# Altium footprint library YS_PCBLIB.PcbLib: 133 footprints (part 6 of 9)
Each footprint in its own frame and in the unit in brackets; x right, y up, seen from the top. Pads: shape width x height; smd on the part's side, far side on the other; paste and mask are expansions set on the pad; w line width, h text height; cw(c..) or ccw(c..) is an arc to the next point about the centre after c.
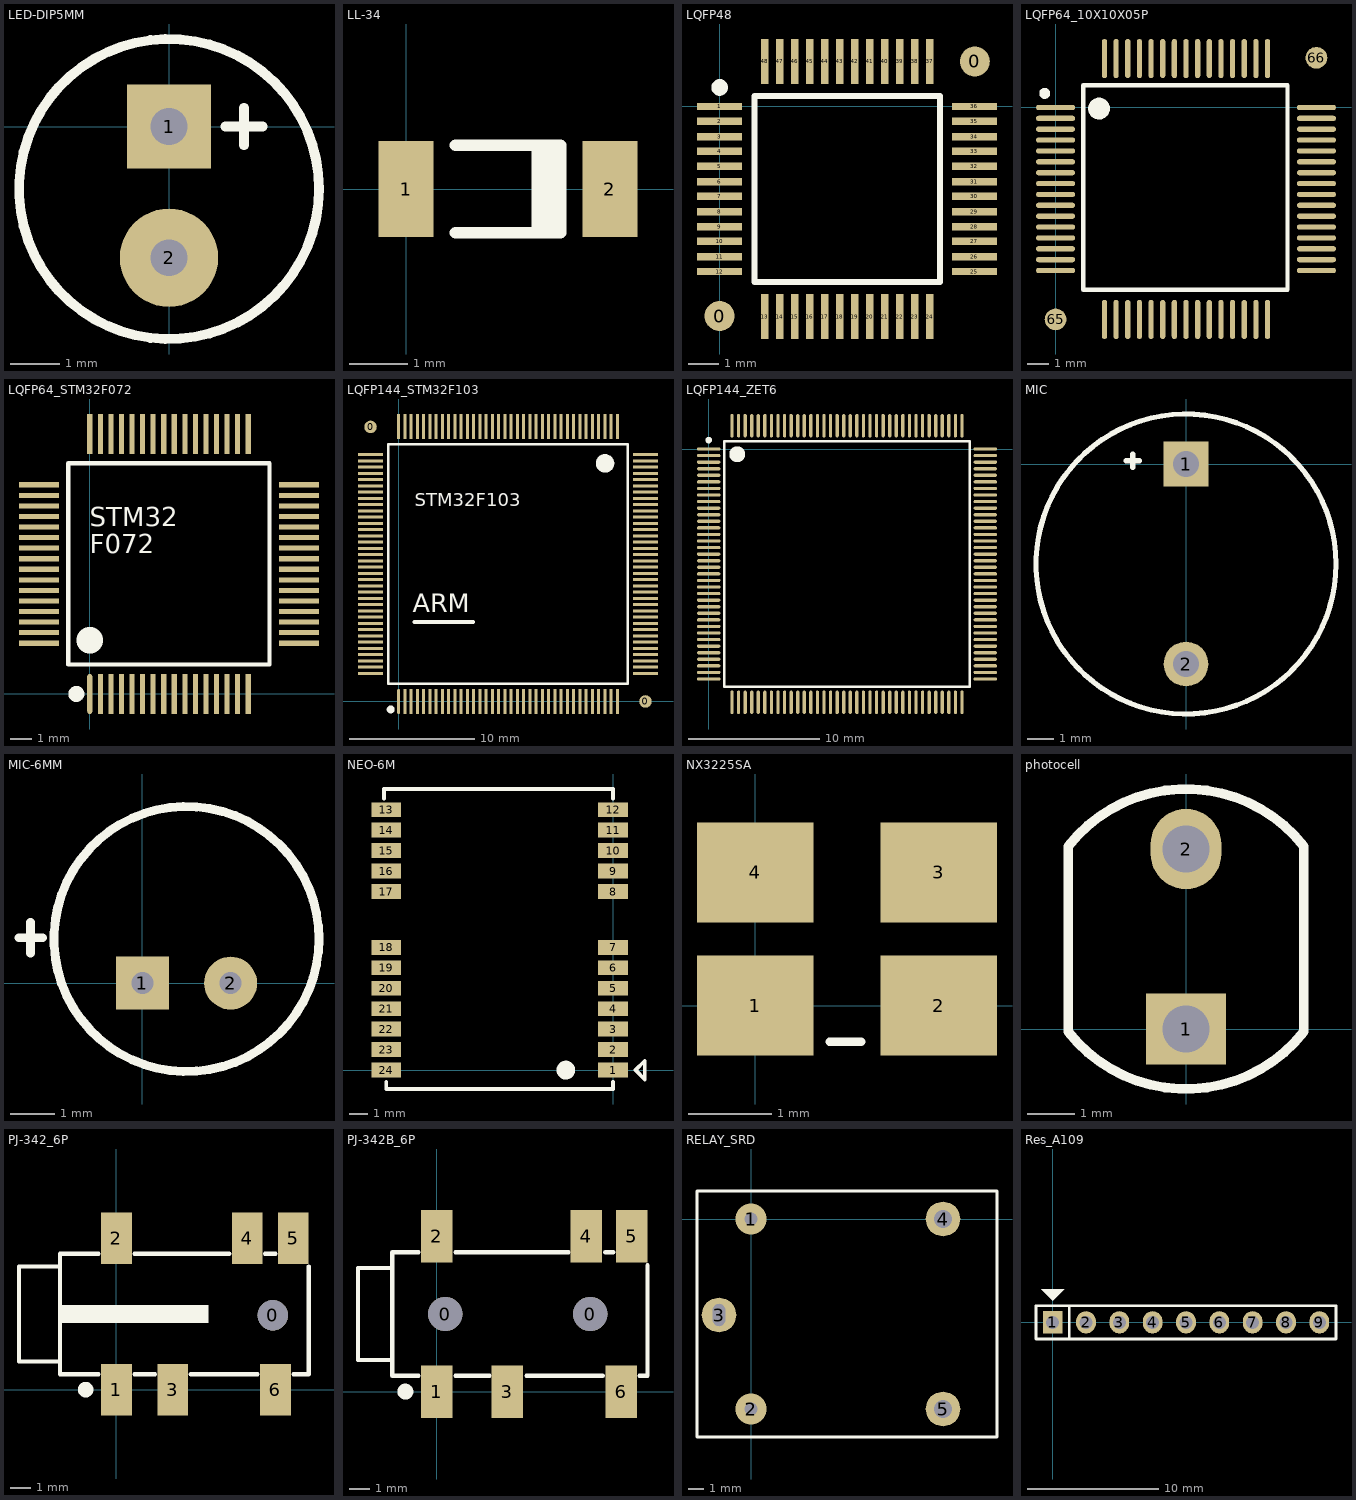
[diagram p5: the footprints below, top view; thin cyan lines are the x and y axes]

## LED-DIP5MM [mm]
pads (2):
  rect 1.7x1.7 hole 0.75: 1(0,0)
  round 2 hole 0.75: 2(0,-2.667)
Top Overlay:
  circle w0.2: c0,-1.27 r3.048
  lines w0.2: 1.143,0 1.905,0 ; 1.524,-0.381 1.524,0.381

## LL-34 [mm]
pads (2):
  rect 0.95x1.65 smd: 1(0,0) 2(3.5,0)
Top Overlay:
  lines w0.2: 0.85,-0.75 2.65,-0.75 2.65,0.75 0.85,0.75 ; 2.25,-0.75 2.25,0.75 ; 2.45,-0.75 2.45,0.75

## LQFP48 [mm]
pads (50):
  round 1 smd: 0(0,-6.985) 0(8.509,1.5)
  rect 1.5x0.25 smd: 1(0,0) 2(0,-0.5) 3(0,-1) 4(0,-1.5) 5(0,-2) 6(0,-2.5) 7(0,-3) 8(0,-3.5) 9(0,-4) 10(0,-4.5) 11(0,-5) 12(0,-5.5) 25(8.495,-5.5) 26(8.495,-5) 27(8.495,-4.5) 28(8.495,-4) 29(8.495,-3.5) 30(8.495,-3) 31(8.495,-2.5) 32(8.495,-2) 33(8.495,-1.5) 34(8.495,-1) 35(8.495,-0.5) 36(8.495,0)
  rect 0.25x1.5 smd: 13(1.5,-7) 14(2,-7) 15(2.5,-7) 16(3,-7) 17(3.5,-7) 18(4,-7) 19(4.5,-7) 20(5,-7) 21(5.5,-7) 22(6,-7) 23(6.5,-7) 24(7,-7) 37(7,1.5) 38(6.5,1.5) 39(6,1.5) 40(5.5,1.5) 41(5,1.5) 42(4.5,1.5) 43(4,1.5) 44(3.5,1.5) 45(3,1.5) 46(2.5,1.5) 47(2,1.5) 48(1.5,1.5)
Top Overlay:
  circle w0.3: c0,0.635 r0.127
  lines w0.2: 1.167,-5.857 1.167,0.357 7.352,0.357 7.352,-5.857 1.167,-5.857

## LQFP64_10X10X05P [mm]
pads (66):
  oval 1.8x0.24 smd: 1(0,0) 2(0,-0.5) 3(0,-1) 4(0,-1.5) 5(0,-2) 6(0,-2.5) 7(0,-3) 8(0,-3.5) 9(0,-4) 10(0,-4.5) 11(0,-5) 12(0,-5.5) 13(0,-6) 14(0,-6.5) 15(0,-7) 16(0,-7.5) 33(12,-7.5) 34(12,-7) 35(12,-6.5) 36(12,-6) 37(12,-5.5) 38(12,-5) 39(12,-4.5) 40(12,-4) 41(12,-3.5) 42(12,-3) 43(12,-2.5) 44(12,-2) 45(12,-1.5) 46(12,-1) 47(12,-0.5) 48(12,0)
  oval 0.24x1.8 smd: 17(2.25,-9.75) 18(2.786,-9.75) 19(3.321,-9.75) 20(3.857,-9.75) 21(4.393,-9.75) 22(4.929,-9.75) 23(4.929,-9.75) 24(5.464,-9.75) 25(6,-9.75) 26(6.536,-9.75) 27(7.071,-9.75) 28(7.607,-9.75) 29(8.143,-9.75) 30(8.679,-9.75) 31(9.214,-9.75) 32(9.75,-9.75) 49(9.75,2.25) 50(9.214,2.25) 51(8.679,2.25) 52(8.143,2.25) 53(7.607,2.25) 54(7.071,2.25) 55(6.536,2.25) 56(6,2.25) 57(5.464,2.25) 58(4.929,2.25) 59(4.393,2.25) 60(4.393,2.25) 61(3.857,2.25) 62(3.321,2.25) 63(2.786,2.25) 64(2.25,2.25)
  round 1 smd: 65(0,-9.75) 66(12,2.286)
Top Overlay:
  circle w0.25: c-0.5,0.65 r0.125
  circle w0.5: c2,-0.05 r0.25
  lines w0.203: 1.27,-8.382 10.668,-8.382 10.668,1.016 1.27,1.016 1.27,-8.382

## LQFP64_STM32F072 [mm]
pads (64):
  oval 0.24x1.9 smd: 1(0,0)
  rect 0.24x1.9 smd: 2(0.5,0) 3(1,0) 4(1.5,0) 5(2,0) 6(2.5,0) 7(3,0) 8(3.5,0) 9(4,0) 10(4.5,0) 11(5,0) 12(5.5,0) 13(6,0) 14(6.5,0) 15(7,0) 16(7.5,0) 33(7.5,12.3) 34(7,12.3) 35(6.5,12.3) 36(6,12.3) 37(5.5,12.3) 38(5,12.3) 39(4.5,12.3) 40(4,12.3) 41(3.5,12.3) 42(3,12.3) 43(2.5,12.3) 44(2,12.3) 45(1.5,12.3) 46(1,12.3) 47(0.5,12.3) 48(0,12.3)
  rect 1.9x0.24 smd: 17(9.9,2.4) 18(9.9,2.9) 19(9.9,3.4) 20(9.9,3.9) 21(9.9,4.4) 22(9.9,4.9) 23(9.9,5.4) 24(9.9,5.9) 25(9.9,6.4) 26(9.9,6.9) 27(9.9,7.4) 28(9.9,7.9) 29(9.9,8.4) 30(9.9,8.9) 31(9.9,9.4) 32(9.9,9.9) 49(-2.4,9.9) 50(-2.4,9.4) 51(-2.4,8.9) 52(-2.4,8.4) 53(-2.4,7.9) 54(-2.4,7.4) 55(-2.4,6.9) 56(-2.4,6.4) 57(-2.4,5.9) 58(-2.4,5.4) 59(-2.4,4.9) 60(-2.4,4.4) 61(-2.4,3.9) 62(-2.4,3.4) 63(-2.4,2.9) 64(-2.4,2.4)
Top Overlay:
  circle w1: c0,2.54 r0.127
  circle w0.5: c-0.635,0 r0.127
  lines w0.203: -1.016,1.397 8.509,1.397 8.509,10.922 -1.016,10.922 -1.016,1.397
  text "STM32" at 0,7.62 h1.52
  text "F072" at 0,6.35 h1.52

## LQFP144_STM32F103 [mm]
pads (146):
  round 1 smd: 0(-2.25,21.971) 0(19.75,0)
  oval 0.23x2 smd: 1(0,0)
  rect 0.23x2 smd: 2(0.5,0) 3(1,0) 4(1.5,0) 5(2,0) 6(2.5,0) 7(3,0) 8(3.5,0) 9(4,0) 10(4.5,0) 11(5,0) 12(5.5,0) 13(6,0) 14(6.5,0) 15(7,0) 16(7.5,0) 17(8,0) 18(8.5,0) 19(9,0) 20(9.5,0) 21(10,0) 22(10.5,0) 23(11,0) 24(11.5,0) 25(12,0) 26(12.5,0) 27(13,0) 28(13.5,0) 29(14,0) 30(14.5,0) 31(15,0) 32(15.5,0) 33(16,0) 34(16.5,0) 35(17,0) 36(17.5,0) 73(17.5,22) 74(17,22) 75(16.5,22) 76(16,22) 77(15.5,22) 78(15,22) 79(14.5,22) 80(14,22) 81(13.5,22) 82(13,22) 83(12.5,22) 84(12,22) 85(11.5,22) 86(11,22) 87(10.5,22) 88(10,22) 89(9.5,22) 90(9,22) 91(8.5,22) 92(8,22) 93(7.5,22) 94(7,22) 95(6.5,22) 96(6,22) 97(5.5,22) 98(5,22) 99(4.5,22) 100(4,22) 101(3.5,22) 102(3,22) 103(2.5,22) 104(2,22) 105(1.5,22) 106(1,22) 107(0.5,22) 108(0,22)
  rect 2x0.23 smd: 37(19.75,2.25) 38(19.75,2.75) 39(19.75,3.25) 40(19.75,3.75) 41(19.75,4.25) 42(19.75,4.75) 43(19.75,5.25) 44(19.75,5.75) 45(19.75,6.25) 46(19.75,6.75) 47(19.75,7.25) 48(19.75,7.75) 49(19.75,8.25) 50(19.75,8.75) 51(19.75,9.25) 52(19.75,9.75) 53(19.75,10.25) 54(19.75,10.75) 55(19.75,11.25) 56(19.75,11.75) 57(19.75,12.25) 58(19.75,12.75) 59(19.75,13.25) 60(19.75,13.75) 61(19.75,14.25) 62(19.75,14.75) 63(19.75,15.25) 64(19.75,15.75) 65(19.75,16.25) 66(19.75,16.75) 67(19.75,17.25) 68(19.75,17.75) 69(19.75,18.25) 70(19.75,18.75) 71(19.75,19.25) 72(19.75,19.75) 109(-2.25,19.75) 110(-2.25,19.25) 111(-2.25,18.75) 112(-2.25,18.25) 113(-2.25,17.75) 114(-2.25,17.25) 115(-2.25,16.75) 116(-2.25,16.25) 117(-2.25,15.75) 118(-2.25,15.25) 119(-2.25,14.75) 120(-2.25,14.25) 121(-2.25,13.75) 122(-2.25,13.25) 123(-2.25,12.75) 124(-2.25,12.25) 125(-2.25,11.75) 126(-2.25,11.25) 127(-2.25,10.75) 128(-2.25,10.25) 129(-2.25,9.75) 130(-2.25,9.25) 131(-2.25,8.75) 132(-2.25,8.25) 133(-2.25,7.75) 134(-2.25,7.25) 135(-2.25,6.75) 136(-2.25,6.25) 137(-2.25,5.75) 138(-2.25,5.25) 139(-2.25,4.75) 140(-2.25,4.25) 141(-2.25,3.75) 142(-2.25,3.25) 143(-2.25,2.75) 144(-2.25,2.25)
Top Overlay:
  circle w0.381: c-0.635,-0.635 r0.127
  circle w0.762: c16.51,19.05 r0.359
  lines w0.203: -0.838,1.422 18.313,1.422 18.313,20.574 -0.838,20.574 -0.838,1.422
  lines w0.305: 1.27,6.35 5.969,6.35
  text "ARM" at 1.143,6.604 h2.54
  text "STM32F103" at 1.27,15.24 h1.78

## LQFP144_ZET6 [mm]
height 1.6
pads (144):
  oval 1.778x0.25 smd: 1(0,0) 2(0,-0.5) 3(0,-1) 4(0,-1.5) 5(0,-2) 6(0,-2.5) 7(0,-3) 8(0,-3.5) 9(0,-4) 10(0,-4.5) 11(0,-5) 12(0,-5.5) 13(0,-6) 14(0,-6.5) 15(0,-7) 16(0,-7.5) 17(0,-8) 18(0,-8.5) 19(0,-9) 20(0,-9.5) 21(0,-10) 22(0,-10.5) 23(0,-11) 24(0,-11.5) 25(0,-12) 26(0,-12.5) 27(0,-13) 28(0,-13.5) 29(0,-14) 30(0,-14.5) 31(0,-15) 32(0,-15.5) 33(0,-16) 34(0,-16.5) 35(0,-17) 36(0,-17.5) 73(21.05,-17.5) 74(21.05,-17) 75(21.05,-16.5) 76(21.05,-16) 77(21.05,-15.5) 78(21.05,-15) 79(21.05,-14.5) 80(21.05,-14) 81(21.05,-13.5) 82(21.05,-13) 83(21.05,-12.5) 84(21.05,-12) 85(21.05,-11.5) 86(21.05,-11) 87(21.05,-10.5) 88(21.05,-10) 89(21.05,-9.5) 90(21.05,-9) 91(21.05,-8.5) 92(21.05,-8) 93(21.05,-7.5) 94(21.05,-7) 95(21.05,-6.5) 96(21.05,-6) 97(21.05,-5.5) 98(21.05,-5) 99(21.05,-4.5) 100(21.05,-4) 101(21.05,-3.5) 102(21.05,-3) 103(21.05,-2.5) 104(21.05,-2) 105(21.05,-1.5) 106(21.05,-1) 107(21.05,-0.5) 108(21.05,0)
  oval 0.25x1.778 smd: 37(1.775,-19.275) 38(2.275,-19.275) 39(2.775,-19.275) 40(3.275,-19.275) 41(3.775,-19.275) 42(4.275,-19.275) 43(4.775,-19.275) 44(5.275,-19.275) 45(5.775,-19.275) 46(6.275,-19.275) 47(6.775,-19.275) 48(7.275,-19.275) 49(7.775,-19.275) 50(8.275,-19.275) 51(8.775,-19.275) 52(9.275,-19.275) 53(9.775,-19.275) 54(10.275,-19.275) 55(10.775,-19.275) 56(11.275,-19.275) 57(11.775,-19.275) 58(12.275,-19.275) 59(12.775,-19.275) 60(13.275,-19.275) 61(13.775,-19.275) 62(14.275,-19.275) 63(14.775,-19.275) 64(15.275,-19.275) 65(15.775,-19.275) 66(16.275,-19.275) 67(16.775,-19.275) 68(17.275,-19.275) 69(17.775,-19.275) 70(18.275,-19.275) 71(18.775,-19.275) 72(19.275,-19.275) 109(19.275,1.775) 110(18.775,1.775) 111(18.275,1.775) 112(17.775,1.775) 113(17.275,1.775) 114(16.775,1.775) 115(16.275,1.775) 116(15.775,1.775) 117(15.275,1.775) 118(14.775,1.775) 119(14.275,1.775) 120(13.775,1.775) 121(13.275,1.775) 122(12.775,1.775) 123(12.275,1.775) 124(11.775,1.775) 125(11.275,1.775) 126(10.775,1.775) 127(10.275,1.775) 128(9.775,1.775) 129(9.275,1.775) 130(8.775,1.775) 131(8.275,1.775) 132(7.775,1.775) 133(7.275,1.775) 134(6.775,1.775) 135(6.275,1.775) 136(5.775,1.775) 137(5.275,1.775) 138(4.775,1.775) 139(4.275,1.775) 140(3.775,1.775) 141(3.275,1.775) 142(2.775,1.775) 143(2.275,1.775) 144(1.775,1.775)
Top Overlay:
  circle w0.25: c0,0.675 r0.125
  circle w0.6: c2.175,-0.4 r0.3
  lines w0.2: 1.175,-18.1 1.175,0.6 19.875,0.6 19.875,-18.1 1.175,-18.1

## MIC [mm]
pads (2):
  rect 1.7x1.7 hole 1: 1(0,0)
  round 1.7 hole 1: 2(0,-7.62)
Top Overlay:
  circle w0.2: c0,-3.81 r5.715
  lines w0.2: -2.286,0.127 -1.778,0.127 ; -2.032,-0.127 -2.032,0.381 -2.032,0.127

## MIC-6MM [mm]
pads (2):
  rect 1.2x1.2 hole 0.5: 1(0,0)
  round 1.2 hole 0.5: 2(2,0)
Top Overlay:
  circle w0.2: c1,1 r3
  lines w0.2: -2.792,1.03 -2.262,1.03 ; -2.532,0.68 -2.532,1.38

## NEO-6M [mm]
pads (24):
  rect 1.6x0.8 smd: 1(0,0) 2(0,1.1) 3(0,2.2) 4(0,3.3) 5(0,4.4) 6(0,5.5) 7(0,6.6) 8(0,9.6) 9(0,10.7) 10(0,11.8) 11(0,12.9) 12(0,14) 13(-12.2,14) 14(-12.2,12.9) 15(-12.2,11.8) 16(-12.2,10.7) 17(-12.2,9.6) 18(-12.2,6.6) 19(-12.2,5.5) 20(-12.2,4.4) 21(-12.2,3.3) 22(-12.2,2.2) 23(-12.2,1.1) 24(-12.2,0)
Top Overlay:
  circle w0.5: c-2.54,0 r0.254
  lines w0.152: 1.2,0 1.7,-0.5 1.7,0.5 1.2,0
  lines w0.2: -12.319,14.605 -12.319,15.113 0,15.113 0,14.605 ; -12.192,-0.635 -12.192,-1.016 0,-1.016 0,-0.635 ; 1.2,0 1.7,0.5 1.7,-0.5 1.2,0 ; 1.2,0 1.2,0

## NX3225SA [mm]
pads (4):
  rect 1.4x1.2 smd paste-0.06 mask+0.05: 1(0,0) 2(2.2,0) 3(2.2,1.6) 4(0,1.6)
Top Overlay:
  lines w0.1: 0.889,-0.432 1.27,-0.432

## photocell [mm]
pads (2):
  rect 1.7x1.5 hole 1: 1(0,0)
  oval 1.5x1.7 hole 1: 2(0,3.81)
Top Overlay:
  lines w0.203: -2.492,-0.062 ccw(c0,1.905) 2.492,-0.062 2.492,3.872 ccw(c0,1.905) -2.492,3.872 -2.492,-0.062

## PJ-342_6P [mil]
pads (7):
  round 59.06 hole 59.06: 0(305,145)
  rect 60x100 smd: 1(0,0) 2(0,295) 3(110,0) 4(255,295) 5(345,295) 6(310,0)
Top Overlay:
  circle w20: c-60,0 r5
  rectangle: -110,130 180,165
  lines w7.99: 35,30 75,30 ; 35,265 220,265 ; 145,30 275,30 ; 290,265 310,265 ; 345,30 375,30 375,240
  lines w8: -110,55 -190,55 -190,240 -110,240 ; -35,30 -110,30 -110,265 -35,265

## PJ-342B_6P [mil]
pads (8):
  round 65 hole 65: 0(15.75,147.5) 0(291.35,147.5)
  rect 60x100 smd: 1(0,0) 2(0,295) 3(133.86,0) 4(283.46,295) 5(370.08,295) 6(350.39,0)
Top Overlay:
  circle w20: c-60,0 r5
  lines w7.99: -85,60 -150,60 -150,235 -85,235 ; -35,30 -85,30 -85,265 -35,265 ; 35,30 100,30 ; 35,265 250,265 ; 170,30 315,30 ; 320,265 335,265 ; 385,30 400,30 400,240

## RELAY_SRD [mm]
pads (5):
  round 2 hole 0.85: 1(0,0) 2(0,-12.065)
  round 2.2 hole 0.8 slot 1.4 at 90 deg: 3(-2.032,-6.096)
  round 2.2 hole 1.15: 4(12.192,0) 5(12.192,-12.065)
Top Overlay:
  lines w0.203: -3.429,-13.843 -3.429,1.778 15.621,1.778 15.621,-13.843 -3.429,-13.843

## Res_A109 [mm] "Connector; Header; 9 Position"
pads (9):
  rect 1.5x1.7 hole 1: 1(0,0)
  oval 1.5x1.7 hole 1: 2(2.54,0) 3(5.08,0) 4(7.62,0) 5(10.16,0) 6(12.7,0) 7(15.24,0) 8(17.78,0) 9(20.32,0)
Top Overlay:
  region: -0.889,2.54 0,1.651 0.889,2.54
  lines w0.2: 1.27,-1.27 1.27,1.27 ; -1.27,-1.27 21.59,-1.27 21.59,1.27 -1.27,1.27 -1.27,-1.27